# Altium footprint library con-samtec.PCBLIB: 805 footprints (part 6 of 55)
Each footprint in its own frame and in the unit in brackets; x right, y up, seen from the top. Pads: shape width x height; smd on the part's side, far side on the other; paste and mask are expansions set on the pad; w line width, h text height; cw(c..) or ccw(c..) is an arc to the next point about the centre after c.
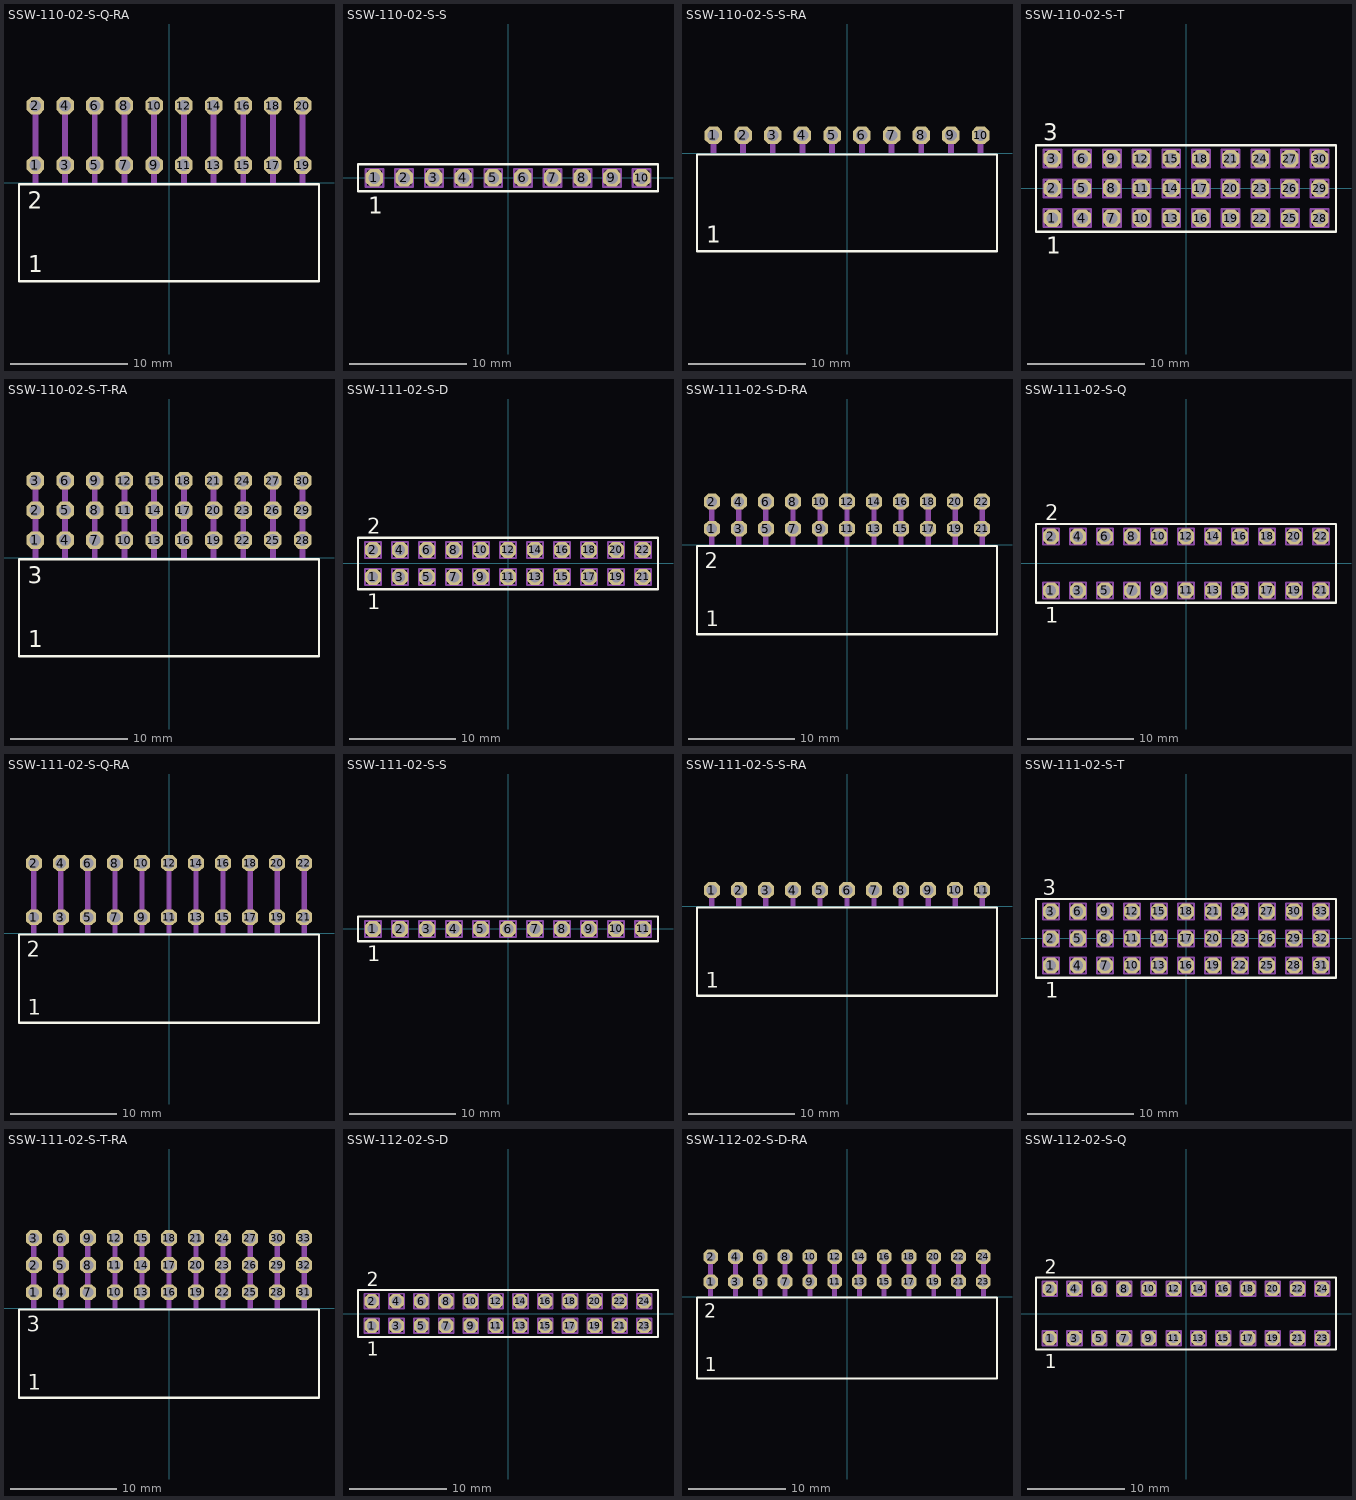
[diagram p5: the footprints below, top view; thin cyan lines are the x and y axes]

## SSW-110-02-S-Q-RA [mil]
pads (20):
  oct 59.06x59.06 hole 39.37: 1(-450,60) 2(-450,260) 3(-350,60) 4(-350,260) 5(-250,60) 6(-250,260) 7(-150,60) 8(-150,260) 9(-50,60) 10(-50,260) 11(50,60) 12(50,260) 13(150,60) 14(150,260) 15(250,60) 16(250,260) 17(350,60) 18(350,260) 19(450,60) 20(450,260)
Top Overlay:
  lines w8: -505.08,-330.55 505.08,-330.55 505.08,-4.17 -505.08,-4.17 -505.08,-330.55
  text "1" at -473.43,-301.18 h56.1
  text "2" at -476.38,-86.61 h56.1
Mechanical 16:
  rectangle: -460,0 -440,270
  rectangle: -360,0 -340,270
  rectangle: -260,0 -240,270
  rectangle: -160,0 -140,270
  rectangle: -60,0 -40,270
  rectangle: 40,0 60,270
  rectangle: 140,0 160,270
  rectangle: 240,0 260,270
  rectangle: 340,0 360,270
  rectangle: 440,0 460,270

## SSW-110-02-S-S [mm]
pads (10):
  oct 1.5x1.5 hole 1: 1(-11.43,0) 2(-8.89,0) 3(-6.35,0) 4(-3.81,0) 5(-1.27,0) 6(1.27,0) 7(3.81,0) 8(6.35,0) 9(8.89,0) 10(11.43,0)
Top Overlay:
  lines w0.203: -12.829,-1.155 12.829,-1.155 12.829,1.155 -12.829,1.155 -12.829,-1.155
  text "1" at -11.938,-3.048 h1.42
Mechanical 16:
  lines w0.203: -12.175,-0.745 -10.675,-0.745 -10.675,0.755 -12.175,0.755 -12.175,-0.745 ; -9.635,-0.745 -8.135,-0.745 -8.135,0.755 -9.635,0.755 -9.635,-0.745 ; -7.095,-0.745 -5.595,-0.745 -5.595,0.755 -7.095,0.755 -7.095,-0.745 ; -4.555,-0.745 -3.055,-0.745 -3.055,0.755 -4.555,0.755 -4.555,-0.745 ; -2.015,-0.745 -0.515,-0.745 -0.515,0.755 -2.015,0.755 -2.015,-0.745 ; 0.525,-0.745 2.025,-0.745 2.025,0.755 0.525,0.755 0.525,-0.745 ; 3.065,-0.745 4.565,-0.745 4.565,0.755 3.065,0.755 3.065,-0.745 ; 5.605,-0.745 7.105,-0.745 7.105,0.755 5.605,0.755 5.605,-0.745 ; 8.145,-0.745 9.645,-0.745 9.645,0.755 8.145,0.755 8.145,-0.745 ; 10.685,-0.745 12.185,-0.745 12.185,0.755 10.685,0.755 10.685,-0.745

## SSW-110-02-S-S-RA [mil]
pads (10):
  oct 59.06x59.06 hole 39.37: 1(-450,60) 2(-350,60) 3(-250,60) 4(-150,60) 5(-50,60) 6(50,60) 7(150,60) 8(250,60) 9(350,60) 10(450,60)
Top Overlay:
  lines w8: -505.08,-330.55 505.08,-330.55 505.08,-4.17 -505.08,-4.17 -505.08,-330.55
  text "1" at -473.43,-301.18 h56.1
Mechanical 16:
  rectangle: -460,0 -440,70
  rectangle: -360,0 -340,70
  rectangle: -260,0 -240,70
  rectangle: -160,0 -140,70
  rectangle: -60,0 -40,70
  rectangle: 40,0 60,70
  rectangle: 140,0 160,70
  rectangle: 240,0 260,70
  rectangle: 340,0 360,70
  rectangle: 440,0 460,70

## SSW-110-02-S-T [mm]
pads (30):
  oct 1.5x1.5 hole 1: 1(-11.43,-2.54) 2(-11.43,0) 3(-11.43,2.54) 4(-8.89,-2.54) 5(-8.89,0) 6(-8.89,2.54) 7(-6.35,-2.54) 8(-6.35,0) 9(-6.35,2.54) 10(-3.81,-2.54) 11(-3.81,0) 12(-3.81,2.54) 13(-1.27,-2.54) 14(-1.27,0) 15(-1.27,2.54) 16(1.27,-2.54) 17(1.27,0) 18(1.27,2.54) 19(3.81,-2.54) 20(3.81,0) 21(3.81,2.54) 22(6.35,-2.54) 23(6.35,0) 24(6.35,2.54) 25(8.89,-2.54) 26(8.89,0) 27(8.89,2.54) 28(11.43,-2.54) 29(11.43,0) 30(11.43,2.54)
Top Overlay:
  lines w0.203: -12.829,-3.695 12.829,-3.695 12.829,3.695 -12.829,3.695 -12.829,-3.695
  text "1" at -11.938,-5.588 h1.42
  text "3" at -12.192,4.064 h1.42
Mechanical 16:
  lines w0.203: -12.175,-3.285 -10.675,-3.285 -10.675,-1.785 -12.175,-1.785 -12.175,-3.285 ; -12.175,-0.745 -10.675,-0.745 -10.675,0.755 -12.175,0.755 -12.175,-0.745 ; -12.175,1.795 -10.675,1.795 -10.675,3.295 -12.175,3.295 -12.175,1.795 ; -9.635,-3.285 -8.135,-3.285 -8.135,-1.785 -9.635,-1.785 -9.635,-3.285 ; -9.635,-0.745 -8.135,-0.745 -8.135,0.755 -9.635,0.755 -9.635,-0.745 ; -9.635,1.795 -8.135,1.795 -8.135,3.295 -9.635,3.295 -9.635,1.795 ; -7.095,-3.285 -5.595,-3.285 -5.595,-1.785 -7.095,-1.785 -7.095,-3.285 ; -7.095,-0.745 -5.595,-0.745 -5.595,0.755 -7.095,0.755 -7.095,-0.745 ; -7.095,1.795 -5.595,1.795 -5.595,3.295 -7.095,3.295 -7.095,1.795 ; -4.555,-3.285 -3.055,-3.285 -3.055,-1.785 -4.555,-1.785 -4.555,-3.285 ; -4.555,-0.745 -3.055,-0.745 -3.055,0.755 -4.555,0.755 -4.555,-0.745 ; -4.555,1.795 -3.055,1.795 -3.055,3.295 -4.555,3.295 -4.555,1.795 ; -2.015,-3.285 -0.515,-3.285 -0.515,-1.785 -2.015,-1.785 -2.015,-3.285 ; -2.015,-0.745 -0.515,-0.745 -0.515,0.755 -2.015,0.755 -2.015,-0.745 ; -2.015,1.795 -0.515,1.795 -0.515,3.295 -2.015,3.295 -2.015,1.795 ; 0.525,-3.285 2.025,-3.285 2.025,-1.785 0.525,-1.785 0.525,-3.285 ; 0.525,-0.745 2.025,-0.745 2.025,0.755 0.525,0.755 0.525,-0.745 ; 0.525,1.795 2.025,1.795 2.025,3.295 0.525,3.295 0.525,1.795 ; 3.065,-3.285 4.565,-3.285 4.565,-1.785 3.065,-1.785 3.065,-3.285 ; 3.065,-0.745 4.565,-0.745 4.565,0.755 3.065,0.755 3.065,-0.745 ; 3.065,1.795 4.565,1.795 4.565,3.295 3.065,3.295 3.065,1.795 ; 5.605,-3.285 7.105,-3.285 7.105,-1.785 5.605,-1.785 5.605,-3.285 ; 5.605,-0.745 7.105,-0.745 7.105,0.755 5.605,0.755 5.605,-0.745 ; 5.605,1.795 7.105,1.795 7.105,3.295 5.605,3.295 5.605,1.795 ; 8.145,-3.285 9.645,-3.285 9.645,-1.785 8.145,-1.785 8.145,-3.285 ; 8.145,-0.745 9.645,-0.745 9.645,0.755 8.145,0.755 8.145,-0.745 ; 8.145,1.795 9.645,1.795 9.645,3.295 8.145,3.295 8.145,1.795 ; 10.685,-3.285 12.185,-3.285 12.185,-1.785 10.685,-1.785 10.685,-3.285 ; 10.685,-0.745 12.185,-0.745 12.185,0.755 10.685,0.755 10.685,-0.745 ; 10.685,1.795 12.185,1.795 12.185,3.295 10.685,3.295 10.685,1.795

## SSW-110-02-S-T-RA [mil]
pads (30):
  oct 59.06x59.06 hole 39.37: 1(-450,60) 2(-450,160) 3(-450,260) 4(-350,60) 5(-350,160) 6(-350,260) 7(-250,60) 8(-250,160) 9(-250,260) 10(-150,60) 11(-150,160) 12(-150,260) 13(-50,60) 14(-50,160) 15(-50,260) 16(50,60) 17(50,160) 18(50,260) 19(150,60) 20(150,160) 21(150,260) 22(250,60) 23(250,160) 24(250,260) 25(350,60) 26(350,160) 27(350,260) 28(450,60) 29(450,160) 30(450,260)
Top Overlay:
  lines w8: -505.08,-330.55 505.08,-330.55 505.08,-4.17 -505.08,-4.17 -505.08,-330.55
  text "1" at -473.43,-301.18 h56.1
  text "3" at -476.38,-86.61 h56.1
Mechanical 16:
  rectangle: -460,0 -440,270
  rectangle: -360,0 -340,270
  rectangle: -260,0 -240,270
  rectangle: -160,0 -140,270
  rectangle: -60,0 -40,270
  rectangle: 40,0 60,270
  rectangle: 140,0 160,270
  rectangle: 240,0 260,270
  rectangle: 340,0 360,270
  rectangle: 440,0 460,270

## SSW-111-02-S-D [mm]
pads (22):
  oct 1.5x1.5 hole 1: 1(-12.7,-1.27) 2(-12.7,1.27) 3(-10.16,-1.27) 4(-10.16,1.27) 5(-7.62,-1.27) 6(-7.62,1.27) 7(-5.08,-1.27) 8(-5.08,1.27) 9(-2.54,-1.27) 10(-2.54,1.27) 11(0,-1.27) 12(0,1.27) 13(2.54,-1.27) 14(2.54,1.27) 15(5.08,-1.27) 16(5.08,1.27) 17(7.62,-1.27) 18(7.62,1.27) 19(10.16,-1.27) 20(10.16,1.27) 21(12.7,-1.27) 22(12.7,1.27)
Top Overlay:
  lines w0.203: -14.099,-2.425 14.099,-2.425 14.099,2.425 -14.099,2.425 -14.099,-2.425
  text "1" at -13.208,-4.318 h1.42
  text "2" at -13.208,2.794 h1.42
Mechanical 16:
  lines w0.203: -13.445,-2.015 -11.945,-2.015 -11.945,-0.515 -13.445,-0.515 -13.445,-2.015 ; -13.445,0.525 -11.945,0.525 -11.945,2.025 -13.445,2.025 -13.445,0.525 ; -10.905,-2.015 -9.405,-2.015 -9.405,-0.515 -10.905,-0.515 -10.905,-2.015 ; -10.905,0.525 -9.405,0.525 -9.405,2.025 -10.905,2.025 -10.905,0.525 ; -8.365,-2.015 -6.865,-2.015 -6.865,-0.515 -8.365,-0.515 -8.365,-2.015 ; -8.365,0.525 -6.865,0.525 -6.865,2.025 -8.365,2.025 -8.365,0.525 ; -5.825,-2.015 -4.325,-2.015 -4.325,-0.515 -5.825,-0.515 -5.825,-2.015 ; -5.825,0.525 -4.325,0.525 -4.325,2.025 -5.825,2.025 -5.825,0.525 ; -3.285,-2.015 -1.785,-2.015 -1.785,-0.515 -3.285,-0.515 -3.285,-2.015 ; -3.285,0.525 -1.785,0.525 -1.785,2.025 -3.285,2.025 -3.285,0.525 ; -0.745,-2.015 0.755,-2.015 0.755,-0.515 -0.745,-0.515 -0.745,-2.015 ; -0.745,0.525 0.755,0.525 0.755,2.025 -0.745,2.025 -0.745,0.525 ; 1.795,-2.015 3.295,-2.015 3.295,-0.515 1.795,-0.515 1.795,-2.015 ; 1.795,0.525 3.295,0.525 3.295,2.025 1.795,2.025 1.795,0.525 ; 4.335,-2.015 5.835,-2.015 5.835,-0.515 4.335,-0.515 4.335,-2.015 ; 4.335,0.525 5.835,0.525 5.835,2.025 4.335,2.025 4.335,0.525 ; 6.875,-2.015 8.375,-2.015 8.375,-0.515 6.875,-0.515 6.875,-2.015 ; 6.875,0.525 8.375,0.525 8.375,2.025 6.875,2.025 6.875,0.525 ; 9.415,-2.015 10.915,-2.015 10.915,-0.515 9.415,-0.515 9.415,-2.015 ; 9.415,0.525 10.915,0.525 10.915,2.025 9.415,2.025 9.415,0.525 ; 11.955,-2.015 13.455,-2.015 13.455,-0.515 11.955,-0.515 11.955,-2.015 ; 11.955,0.525 13.455,0.525 13.455,2.025 11.955,2.025 11.955,0.525

## SSW-111-02-S-D-RA [mil]
pads (22):
  oct 59.06x59.06 hole 39.37: 1(-500,60) 2(-500,160) 3(-400,60) 4(-400,160) 5(-300,60) 6(-300,160) 7(-200,60) 8(-200,160) 9(-100,60) 10(-100,160) 11(0,60) 12(0,160) 13(100,60) 14(100,160) 15(200,60) 16(200,160) 17(300,60) 18(300,160) 19(400,60) 20(400,160) 21(500,60) 22(500,160)
Top Overlay:
  lines w8: -555.08,-330.55 555.08,-330.55 555.08,-4.17 -555.08,-4.17 -555.08,-330.55
  text "1" at -523.43,-301.18 h56.1
  text "2" at -526.38,-86.61 h56.1
Mechanical 16:
  rectangle: -510,0 -490,170
  rectangle: -410,0 -390,170
  rectangle: -310,0 -290,170
  rectangle: -210,0 -190,170
  rectangle: -110,0 -90,170
  rectangle: -10,0 10,170
  rectangle: 90,0 110,170
  rectangle: 190,0 210,170
  rectangle: 290,0 310,170
  rectangle: 390,0 410,170
  rectangle: 490,0 510,170

## SSW-111-02-S-Q [mm]
pads (22):
  oct 1.5x1.5 hole 1: 1(-12.7,-2.54) 2(-12.7,2.54) 3(-10.16,-2.54) 4(-10.16,2.54) 5(-7.62,-2.54) 6(-7.62,2.54) 7(-5.08,-2.54) 8(-5.08,2.54) 9(-2.54,-2.54) 10(-2.54,2.54) 11(0,-2.54) 12(0,2.54) 13(2.54,-2.54) 14(2.54,2.54) 15(5.08,-2.54) 16(5.08,2.54) 17(7.62,-2.54) 18(7.62,2.54) 19(10.16,-2.54) 20(10.16,2.54) 21(12.7,-2.54) 22(12.7,2.54)
Top Overlay:
  lines w0.203: -14.099,-3.695 14.099,-3.695 14.099,3.695 -14.099,3.695 -14.099,-3.695
  text "1" at -13.208,-5.588 h1.42
  text "2" at -13.208,4.064 h1.42
Mechanical 16:
  lines w0.203: -13.445,-3.285 -11.945,-3.285 -11.945,-1.785 -13.445,-1.785 -13.445,-3.285 ; -13.445,1.795 -11.945,1.795 -11.945,3.295 -13.445,3.295 -13.445,1.795 ; -10.905,-3.285 -9.405,-3.285 -9.405,-1.785 -10.905,-1.785 -10.905,-3.285 ; -10.905,1.795 -9.405,1.795 -9.405,3.295 -10.905,3.295 -10.905,1.795 ; -8.365,-3.285 -6.865,-3.285 -6.865,-1.785 -8.365,-1.785 -8.365,-3.285 ; -8.365,1.795 -6.865,1.795 -6.865,3.295 -8.365,3.295 -8.365,1.795 ; -5.825,-3.285 -4.325,-3.285 -4.325,-1.785 -5.825,-1.785 -5.825,-3.285 ; -5.825,1.795 -4.325,1.795 -4.325,3.295 -5.825,3.295 -5.825,1.795 ; -3.285,-3.285 -1.785,-3.285 -1.785,-1.785 -3.285,-1.785 -3.285,-3.285 ; -3.285,1.795 -1.785,1.795 -1.785,3.295 -3.285,3.295 -3.285,1.795 ; -0.745,-3.285 0.755,-3.285 0.755,-1.785 -0.745,-1.785 -0.745,-3.285 ; -0.745,1.795 0.755,1.795 0.755,3.295 -0.745,3.295 -0.745,1.795 ; 1.795,-3.285 3.295,-3.285 3.295,-1.785 1.795,-1.785 1.795,-3.285 ; 1.795,1.795 3.295,1.795 3.295,3.295 1.795,3.295 1.795,1.795 ; 4.335,-3.285 5.835,-3.285 5.835,-1.785 4.335,-1.785 4.335,-3.285 ; 4.335,1.795 5.835,1.795 5.835,3.295 4.335,3.295 4.335,1.795 ; 6.875,-3.285 8.375,-3.285 8.375,-1.785 6.875,-1.785 6.875,-3.285 ; 6.875,1.795 8.375,1.795 8.375,3.295 6.875,3.295 6.875,1.795 ; 9.415,-3.285 10.915,-3.285 10.915,-1.785 9.415,-1.785 9.415,-3.285 ; 9.415,1.795 10.915,1.795 10.915,3.295 9.415,3.295 9.415,1.795 ; 11.955,-3.285 13.455,-3.285 13.455,-1.785 11.955,-1.785 11.955,-3.285 ; 11.955,1.795 13.455,1.795 13.455,3.295 11.955,3.295 11.955,1.795

## SSW-111-02-S-Q-RA [mil]
pads (22):
  oct 59.06x59.06 hole 39.37: 1(-500,60) 2(-500,260) 3(-400,60) 4(-400,260) 5(-300,60) 6(-300,260) 7(-200,60) 8(-200,260) 9(-100,60) 10(-100,260) 11(0,60) 12(0,260) 13(100,60) 14(100,260) 15(200,60) 16(200,260) 17(300,60) 18(300,260) 19(400,60) 20(400,260) 21(500,60) 22(500,260)
Top Overlay:
  lines w8: -555.08,-330.55 555.08,-330.55 555.08,-4.17 -555.08,-4.17 -555.08,-330.55
  text "1" at -523.43,-301.18 h56.1
  text "2" at -526.38,-86.61 h56.1
Mechanical 16:
  rectangle: -510,0 -490,270
  rectangle: -410,0 -390,270
  rectangle: -310,0 -290,270
  rectangle: -210,0 -190,270
  rectangle: -110,0 -90,270
  rectangle: -10,0 10,270
  rectangle: 90,0 110,270
  rectangle: 190,0 210,270
  rectangle: 290,0 310,270
  rectangle: 390,0 410,270
  rectangle: 490,0 510,270

## SSW-111-02-S-S [mm]
pads (11):
  oct 1.5x1.5 hole 1: 1(-12.7,0) 2(-10.16,0) 3(-7.62,0) 4(-5.08,0) 5(-2.54,0) 6(0,0) 7(2.54,0) 8(5.08,0) 9(7.62,0) 10(10.16,0) 11(12.7,0)
Top Overlay:
  lines w0.203: -14.099,-1.155 14.099,-1.155 14.099,1.155 -14.099,1.155 -14.099,-1.155
  text "1" at -13.208,-3.048 h1.42
Mechanical 16:
  lines w0.203: -13.445,-0.745 -11.945,-0.745 -11.945,0.755 -13.445,0.755 -13.445,-0.745 ; -10.905,-0.745 -9.405,-0.745 -9.405,0.755 -10.905,0.755 -10.905,-0.745 ; -8.365,-0.745 -6.865,-0.745 -6.865,0.755 -8.365,0.755 -8.365,-0.745 ; -5.825,-0.745 -4.325,-0.745 -4.325,0.755 -5.825,0.755 -5.825,-0.745 ; -3.285,-0.745 -1.785,-0.745 -1.785,0.755 -3.285,0.755 -3.285,-0.745 ; -0.745,-0.745 0.755,-0.745 0.755,0.755 -0.745,0.755 -0.745,-0.745 ; 1.795,-0.745 3.295,-0.745 3.295,0.755 1.795,0.755 1.795,-0.745 ; 4.335,-0.745 5.835,-0.745 5.835,0.755 4.335,0.755 4.335,-0.745 ; 6.875,-0.745 8.375,-0.745 8.375,0.755 6.875,0.755 6.875,-0.745 ; 9.415,-0.745 10.915,-0.745 10.915,0.755 9.415,0.755 9.415,-0.745 ; 11.955,-0.745 13.455,-0.745 13.455,0.755 11.955,0.755 11.955,-0.745

## SSW-111-02-S-S-RA [mil]
pads (11):
  oct 59.06x59.06 hole 39.37: 1(-500,60) 2(-400,60) 3(-300,60) 4(-200,60) 5(-100,60) 6(0,60) 7(100,60) 8(200,60) 9(300,60) 10(400,60) 11(500,60)
Top Overlay:
  lines w8: -555.08,-330.55 555.08,-330.55 555.08,-4.17 -555.08,-4.17 -555.08,-330.55
  text "1" at -523.43,-301.18 h56.1
Mechanical 16:
  rectangle: -510,0 -490,70
  rectangle: -410,0 -390,70
  rectangle: -310,0 -290,70
  rectangle: -210,0 -190,70
  rectangle: -110,0 -90,70
  rectangle: -10,0 10,70
  rectangle: 90,0 110,70
  rectangle: 190,0 210,70
  rectangle: 290,0 310,70
  rectangle: 390,0 410,70
  rectangle: 490,0 510,70

## SSW-111-02-S-T [mm]
pads (33):
  oct 1.5x1.5 hole 1: 1(-12.7,-2.54) 2(-12.7,0) 3(-12.7,2.54) 4(-10.16,-2.54) 5(-10.16,0) 6(-10.16,2.54) 7(-7.62,-2.54) 8(-7.62,0) 9(-7.62,2.54) 10(-5.08,-2.54) 11(-5.08,0) 12(-5.08,2.54) 13(-2.54,-2.54) 14(-2.54,0) 15(-2.54,2.54) 16(0,-2.54) 17(0,0) 18(0,2.54) 19(2.54,-2.54) 20(2.54,0) 21(2.54,2.54) 22(5.08,-2.54) 23(5.08,0) 24(5.08,2.54) 25(7.62,-2.54) 26(7.62,0) 27(7.62,2.54) 28(10.16,-2.54) 29(10.16,0) 30(10.16,2.54) 31(12.7,-2.54) 32(12.7,0) 33(12.7,2.54)
Top Overlay:
  lines w0.203: -14.099,-3.695 14.099,-3.695 14.099,3.695 -14.099,3.695 -14.099,-3.695
  text "1" at -13.208,-5.588 h1.42
  text "3" at -13.462,4.064 h1.42
Mechanical 16:
  lines w0.203: -13.445,-3.285 -11.945,-3.285 -11.945,-1.785 -13.445,-1.785 -13.445,-3.285 ; -13.445,-0.745 -11.945,-0.745 -11.945,0.755 -13.445,0.755 -13.445,-0.745 ; -13.445,1.795 -11.945,1.795 -11.945,3.295 -13.445,3.295 -13.445,1.795 ; -10.905,-3.285 -9.405,-3.285 -9.405,-1.785 -10.905,-1.785 -10.905,-3.285 ; -10.905,-0.745 -9.405,-0.745 -9.405,0.755 -10.905,0.755 -10.905,-0.745 ; -10.905,1.795 -9.405,1.795 -9.405,3.295 -10.905,3.295 -10.905,1.795 ; -8.365,-3.285 -6.865,-3.285 -6.865,-1.785 -8.365,-1.785 -8.365,-3.285 ; -8.365,-0.745 -6.865,-0.745 -6.865,0.755 -8.365,0.755 -8.365,-0.745 ; -8.365,1.795 -6.865,1.795 -6.865,3.295 -8.365,3.295 -8.365,1.795 ; -5.825,-3.285 -4.325,-3.285 -4.325,-1.785 -5.825,-1.785 -5.825,-3.285 ; -5.825,-0.745 -4.325,-0.745 -4.325,0.755 -5.825,0.755 -5.825,-0.745 ; -5.825,1.795 -4.325,1.795 -4.325,3.295 -5.825,3.295 -5.825,1.795 ; -3.285,-3.285 -1.785,-3.285 -1.785,-1.785 -3.285,-1.785 -3.285,-3.285 ; -3.285,-0.745 -1.785,-0.745 -1.785,0.755 -3.285,0.755 -3.285,-0.745 ; -3.285,1.795 -1.785,1.795 -1.785,3.295 -3.285,3.295 -3.285,1.795 ; -0.745,-3.285 0.755,-3.285 0.755,-1.785 -0.745,-1.785 -0.745,-3.285 ; -0.745,-0.745 0.755,-0.745 0.755,0.755 -0.745,0.755 -0.745,-0.745 ; -0.745,1.795 0.755,1.795 0.755,3.295 -0.745,3.295 -0.745,1.795 ; 1.795,-3.285 3.295,-3.285 3.295,-1.785 1.795,-1.785 1.795,-3.285 ; 1.795,-0.745 3.295,-0.745 3.295,0.755 1.795,0.755 1.795,-0.745 ; 1.795,1.795 3.295,1.795 3.295,3.295 1.795,3.295 1.795,1.795 ; 4.335,-3.285 5.835,-3.285 5.835,-1.785 4.335,-1.785 4.335,-3.285 ; 4.335,-0.745 5.835,-0.745 5.835,0.755 4.335,0.755 4.335,-0.745 ; 4.335,1.795 5.835,1.795 5.835,3.295 4.335,3.295 4.335,1.795 ; 6.875,-3.285 8.375,-3.285 8.375,-1.785 6.875,-1.785 6.875,-3.285 ; 6.875,-0.745 8.375,-0.745 8.375,0.755 6.875,0.755 6.875,-0.745 ; 6.875,1.795 8.375,1.795 8.375,3.295 6.875,3.295 6.875,1.795 ; 9.415,-3.285 10.915,-3.285 10.915,-1.785 9.415,-1.785 9.415,-3.285 ; 9.415,-0.745 10.915,-0.745 10.915,0.755 9.415,0.755 9.415,-0.745 ; 9.415,1.795 10.915,1.795 10.915,3.295 9.415,3.295 9.415,1.795 ; 11.955,-3.285 13.455,-3.285 13.455,-1.785 11.955,-1.785 11.955,-3.285 ; 11.955,-0.745 13.455,-0.745 13.455,0.755 11.955,0.755 11.955,-0.745 ; 11.955,1.795 13.455,1.795 13.455,3.295 11.955,3.295 11.955,1.795

## SSW-111-02-S-T-RA [mil]
pads (33):
  oct 59.06x59.06 hole 39.37: 1(-500,60) 2(-500,160) 3(-500,260) 4(-400,60) 5(-400,160) 6(-400,260) 7(-300,60) 8(-300,160) 9(-300,260) 10(-200,60) 11(-200,160) 12(-200,260) 13(-100,60) 14(-100,160) 15(-100,260) 16(0,60) 17(0,160) 18(0,260) 19(100,60) 20(100,160) 21(100,260) 22(200,60) 23(200,160) 24(200,260) 25(300,60) 26(300,160) 27(300,260) 28(400,60) 29(400,160) 30(400,260) 31(500,60) 32(500,160) 33(500,260)
Top Overlay:
  lines w8: -555.08,-330.55 555.08,-330.55 555.08,-4.17 -555.08,-4.17 -555.08,-330.55
  text "1" at -523.43,-301.18 h56.1
  text "3" at -526.38,-86.61 h56.1
Mechanical 16:
  rectangle: -510,0 -490,270
  rectangle: -410,0 -390,270
  rectangle: -310,0 -290,270
  rectangle: -210,0 -190,270
  rectangle: -110,0 -90,270
  rectangle: -10,0 10,270
  rectangle: 90,0 110,270
  rectangle: 190,0 210,270
  rectangle: 290,0 310,270
  rectangle: 390,0 410,270
  rectangle: 490,0 510,270

## SSW-112-02-S-D [mm]
pads (24):
  oct 1.5x1.5 hole 1: 1(-13.97,-1.27) 2(-13.97,1.27) 3(-11.43,-1.27) 4(-11.43,1.27) 5(-8.89,-1.27) 6(-8.89,1.27) 7(-6.35,-1.27) 8(-6.35,1.27) 9(-3.81,-1.27) 10(-3.81,1.27) 11(-1.27,-1.27) 12(-1.27,1.27) 13(1.27,-1.27) 14(1.27,1.27) 15(3.81,-1.27) 16(3.81,1.27) 17(6.35,-1.27) 18(6.35,1.27) 19(8.89,-1.27) 20(8.89,1.27) 21(11.43,-1.27) 22(11.43,1.27) 23(13.97,-1.27) 24(13.97,1.27)
Top Overlay:
  lines w0.203: -15.369,-2.425 15.369,-2.425 15.369,2.425 -15.369,2.425 -15.369,-2.425
  text "1" at -14.478,-4.318 h1.42
  text "2" at -14.478,2.794 h1.42
Mechanical 16:
  lines w0.203: -14.715,-2.015 -13.215,-2.015 -13.215,-0.515 -14.715,-0.515 -14.715,-2.015 ; -14.715,0.525 -13.215,0.525 -13.215,2.025 -14.715,2.025 -14.715,0.525 ; -12.175,-2.015 -10.675,-2.015 -10.675,-0.515 -12.175,-0.515 -12.175,-2.015 ; -12.175,0.525 -10.675,0.525 -10.675,2.025 -12.175,2.025 -12.175,0.525 ; -9.635,-2.015 -8.135,-2.015 -8.135,-0.515 -9.635,-0.515 -9.635,-2.015 ; -9.635,0.525 -8.135,0.525 -8.135,2.025 -9.635,2.025 -9.635,0.525 ; -7.095,-2.015 -5.595,-2.015 -5.595,-0.515 -7.095,-0.515 -7.095,-2.015 ; -7.095,0.525 -5.595,0.525 -5.595,2.025 -7.095,2.025 -7.095,0.525 ; -4.555,-2.015 -3.055,-2.015 -3.055,-0.515 -4.555,-0.515 -4.555,-2.015 ; -4.555,0.525 -3.055,0.525 -3.055,2.025 -4.555,2.025 -4.555,0.525 ; -2.015,-2.015 -0.515,-2.015 -0.515,-0.515 -2.015,-0.515 -2.015,-2.015 ; -2.015,0.525 -0.515,0.525 -0.515,2.025 -2.015,2.025 -2.015,0.525 ; 0.525,-2.015 2.025,-2.015 2.025,-0.515 0.525,-0.515 0.525,-2.015 ; 0.525,0.525 2.025,0.525 2.025,2.025 0.525,2.025 0.525,0.525 ; 3.065,-2.015 4.565,-2.015 4.565,-0.515 3.065,-0.515 3.065,-2.015 ; 3.065,0.525 4.565,0.525 4.565,2.025 3.065,2.025 3.065,0.525 ; 5.605,-2.015 7.105,-2.015 7.105,-0.515 5.605,-0.515 5.605,-2.015 ; 5.605,0.525 7.105,0.525 7.105,2.025 5.605,2.025 5.605,0.525 ; 8.145,-2.015 9.645,-2.015 9.645,-0.515 8.145,-0.515 8.145,-2.015 ; 8.145,0.525 9.645,0.525 9.645,2.025 8.145,2.025 8.145,0.525 ; 10.685,-2.015 12.185,-2.015 12.185,-0.515 10.685,-0.515 10.685,-2.015 ; 10.685,0.525 12.185,0.525 12.185,2.025 10.685,2.025 10.685,0.525 ; 13.225,-2.015 14.725,-2.015 14.725,-0.515 13.225,-0.515 13.225,-2.015 ; 13.225,0.525 14.725,0.525 14.725,2.025 13.225,2.025 13.225,0.525

## SSW-112-02-S-D-RA [mil]
pads (24):
  oct 59.06x59.06 hole 39.37: 1(-550,60) 2(-550,160) 3(-450,60) 4(-450,160) 5(-350,60) 6(-350,160) 7(-250,60) 8(-250,160) 9(-150,60) 10(-150,160) 11(-50,60) 12(-50,160) 13(50,60) 14(50,160) 15(150,60) 16(150,160) 17(250,60) 18(250,160) 19(350,60) 20(350,160) 21(450,60) 22(450,160) 23(550,60) 24(550,160)
Top Overlay:
  lines w8: -605.08,-330.55 605.08,-330.55 605.08,-4.17 -605.08,-4.17 -605.08,-330.55
  text "1" at -573.43,-301.18 h56.1
  text "2" at -576.38,-86.61 h56.1
Mechanical 16:
  rectangle: -560,0 -540,170
  rectangle: -460,0 -440,170
  rectangle: -360,0 -340,170
  rectangle: -260,0 -240,170
  rectangle: -160,0 -140,170
  rectangle: -60,0 -40,170
  rectangle: 40,0 60,170
  rectangle: 140,0 160,170
  rectangle: 240,0 260,170
  rectangle: 340,0 360,170
  rectangle: 440,0 460,170
  rectangle: 540,0 560,170

## SSW-112-02-S-Q [mm]
pads (24):
  oct 1.5x1.5 hole 1: 1(-13.97,-2.54) 2(-13.97,2.54) 3(-11.43,-2.54) 4(-11.43,2.54) 5(-8.89,-2.54) 6(-8.89,2.54) 7(-6.35,-2.54) 8(-6.35,2.54) 9(-3.81,-2.54) 10(-3.81,2.54) 11(-1.27,-2.54) 12(-1.27,2.54) 13(1.27,-2.54) 14(1.27,2.54) 15(3.81,-2.54) 16(3.81,2.54) 17(6.35,-2.54) 18(6.35,2.54) 19(8.89,-2.54) 20(8.89,2.54) 21(11.43,-2.54) 22(11.43,2.54) 23(13.97,-2.54) 24(13.97,2.54)
Top Overlay:
  lines w0.203: -15.369,-3.695 15.369,-3.695 15.369,3.695 -15.369,3.695 -15.369,-3.695
  text "1" at -14.478,-5.588 h1.42
  text "2" at -14.478,4.064 h1.42
Mechanical 16:
  lines w0.203: -14.715,-3.285 -13.215,-3.285 -13.215,-1.785 -14.715,-1.785 -14.715,-3.285 ; -14.715,1.795 -13.215,1.795 -13.215,3.295 -14.715,3.295 -14.715,1.795 ; -12.175,-3.285 -10.675,-3.285 -10.675,-1.785 -12.175,-1.785 -12.175,-3.285 ; -12.175,1.795 -10.675,1.795 -10.675,3.295 -12.175,3.295 -12.175,1.795 ; -9.635,-3.285 -8.135,-3.285 -8.135,-1.785 -9.635,-1.785 -9.635,-3.285 ; -9.635,1.795 -8.135,1.795 -8.135,3.295 -9.635,3.295 -9.635,1.795 ; -7.095,-3.285 -5.595,-3.285 -5.595,-1.785 -7.095,-1.785 -7.095,-3.285 ; -7.095,1.795 -5.595,1.795 -5.595,3.295 -7.095,3.295 -7.095,1.795 ; -4.555,-3.285 -3.055,-3.285 -3.055,-1.785 -4.555,-1.785 -4.555,-3.285 ; -4.555,1.795 -3.055,1.795 -3.055,3.295 -4.555,3.295 -4.555,1.795 ; -2.015,-3.285 -0.515,-3.285 -0.515,-1.785 -2.015,-1.785 -2.015,-3.285 ; -2.015,1.795 -0.515,1.795 -0.515,3.295 -2.015,3.295 -2.015,1.795 ; 0.525,-3.285 2.025,-3.285 2.025,-1.785 0.525,-1.785 0.525,-3.285 ; 0.525,1.795 2.025,1.795 2.025,3.295 0.525,3.295 0.525,1.795 ; 3.065,-3.285 4.565,-3.285 4.565,-1.785 3.065,-1.785 3.065,-3.285 ; 3.065,1.795 4.565,1.795 4.565,3.295 3.065,3.295 3.065,1.795 ; 5.605,-3.285 7.105,-3.285 7.105,-1.785 5.605,-1.785 5.605,-3.285 ; 5.605,1.795 7.105,1.795 7.105,3.295 5.605,3.295 5.605,1.795 ; 8.145,-3.285 9.645,-3.285 9.645,-1.785 8.145,-1.785 8.145,-3.285 ; 8.145,1.795 9.645,1.795 9.645,3.295 8.145,3.295 8.145,1.795 ; 10.685,-3.285 12.185,-3.285 12.185,-1.785 10.685,-1.785 10.685,-3.285 ; 10.685,1.795 12.185,1.795 12.185,3.295 10.685,3.295 10.685,1.795 ; 13.225,-3.285 14.725,-3.285 14.725,-1.785 13.225,-1.785 13.225,-3.285 ; 13.225,1.795 14.725,1.795 14.725,3.295 13.225,3.295 13.225,1.795